# Altium footprint library BBB_Cape_template.PcbLib: 4 footprints
Each footprint in its own frame and in the unit in brackets; x right, y up, seen from the top. Pads: shape width x height; smd on the part's side, far side on the other; paste and mask are expansions set on the pad; w line width, h text height; cw(c..) or ccw(c..) is an arc to the next point about the centre after c.
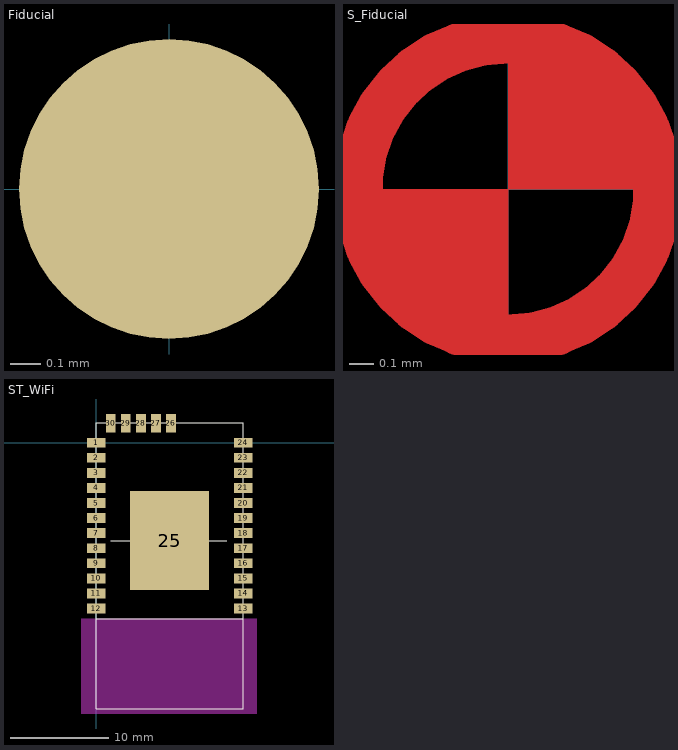
[diagram p0: the footprints below, top view; thin cyan lines are the x and y axes]

## BeagleBone Black 3D [mm] "BeagleBone Black 3D"
3D body: height 13.84, standoff -5.53, extent 0.013,-0.025 90.463,54.635

## Fiducial [mm] "Fiducial"
height 1
pads (1):
  round 1 smd paste-1 mask+0.5: ""(0,0)
3D body: height 0.5, standoff -0.5, extent -0.495,-0.498 0.5,0.498

## S_Fiducial [mm] "Fiducial"
Top Layer:
  region: 0,-0.625 -0.375,-0.5 -0.625,-0.25 -0.625,0 0,0
  region: 0.625,0 0,0 0,0.625 0.375,0.5 0.625,0.25
  lines w0.203: 0,-0.625 ccw(c0,0) 0,0.625 ccw(c0,0) 0,-0.625
Top Solder:
  circle w0.203: c0,0 r0.625
  region: 0.625,0 0.5,-0.375 0.25,-0.625 -0.25,-0.625 -0.5,-0.375 -0.625,0 -0.5,0.375 -0.375,0.5 0,0.625 0.375,0.5 0.5,0.25 0.5,0.375 0.375,0.5

## ST_WiFi [mm]
pads (30):
  rect 1.85x1 smd: 1(0,0) 2(0,-1.524) 3(0,-3.048) 4(0,-4.572) 5(0,-6.096) 6(0,-7.62) 7(0,-9.144) 8(0,-10.668) 9(0,-12.192) 10(0,-13.716) 11(0,-15.24) 12(0,-16.764) 13(14.87,-16.764) 14(14.87,-15.24) 15(14.87,-13.716) 16(14.87,-12.192) 17(14.87,-10.668) 18(14.87,-9.144) 19(14.87,-7.62) 20(14.87,-6.096) 21(14.87,-4.572) 22(14.87,-3.048) 23(14.87,-1.524) 24(14.87,0)
  rect 8x10 smd: 25(7.435,-9.9)
  rect 1x1.85 smd: 26(7.566,1.98) 27(6.042,1.98) 28(4.518,1.98) 29(2.994,1.98) 30(1.47,1.98)
Top Overlay:
  lines w0.1: 0,-17.78 14.87,-17.78 ; 1.496,-9.9 13.208,-9.9 ; 0,-26.924 0,2.032 14.87,2.032 14.87,-26.924 0,-26.924
Keep-Out Layer:
  board cut-out: -1.524,-17.78 16.256,-17.78 16.256,-27.432 -1.524,-27.432
3D body: height 2.3, standoff 0.8, extent 0.508,-17.78 14.224,1.524
3D body: height 2.3, standoff 0.8, extent 0,-26.924 14.87,-22.352
3D body: height 0.8, standoff -0.01, extent 0,-26.924 14.87,2.032